# Altium footprint library VEGG_PcbLib_ALT.PcbLib: 140 footprints (part 5 of 9)
Each footprint in its own frame and in the unit in brackets; x right, y up, seen from the top. Pads: shape width x height; smd on the part's side, far side on the other; paste and mask are expansions set on the pad; w line width, h text height; cw(c..) or ccw(c..) is an arc to the next point about the centre after c.
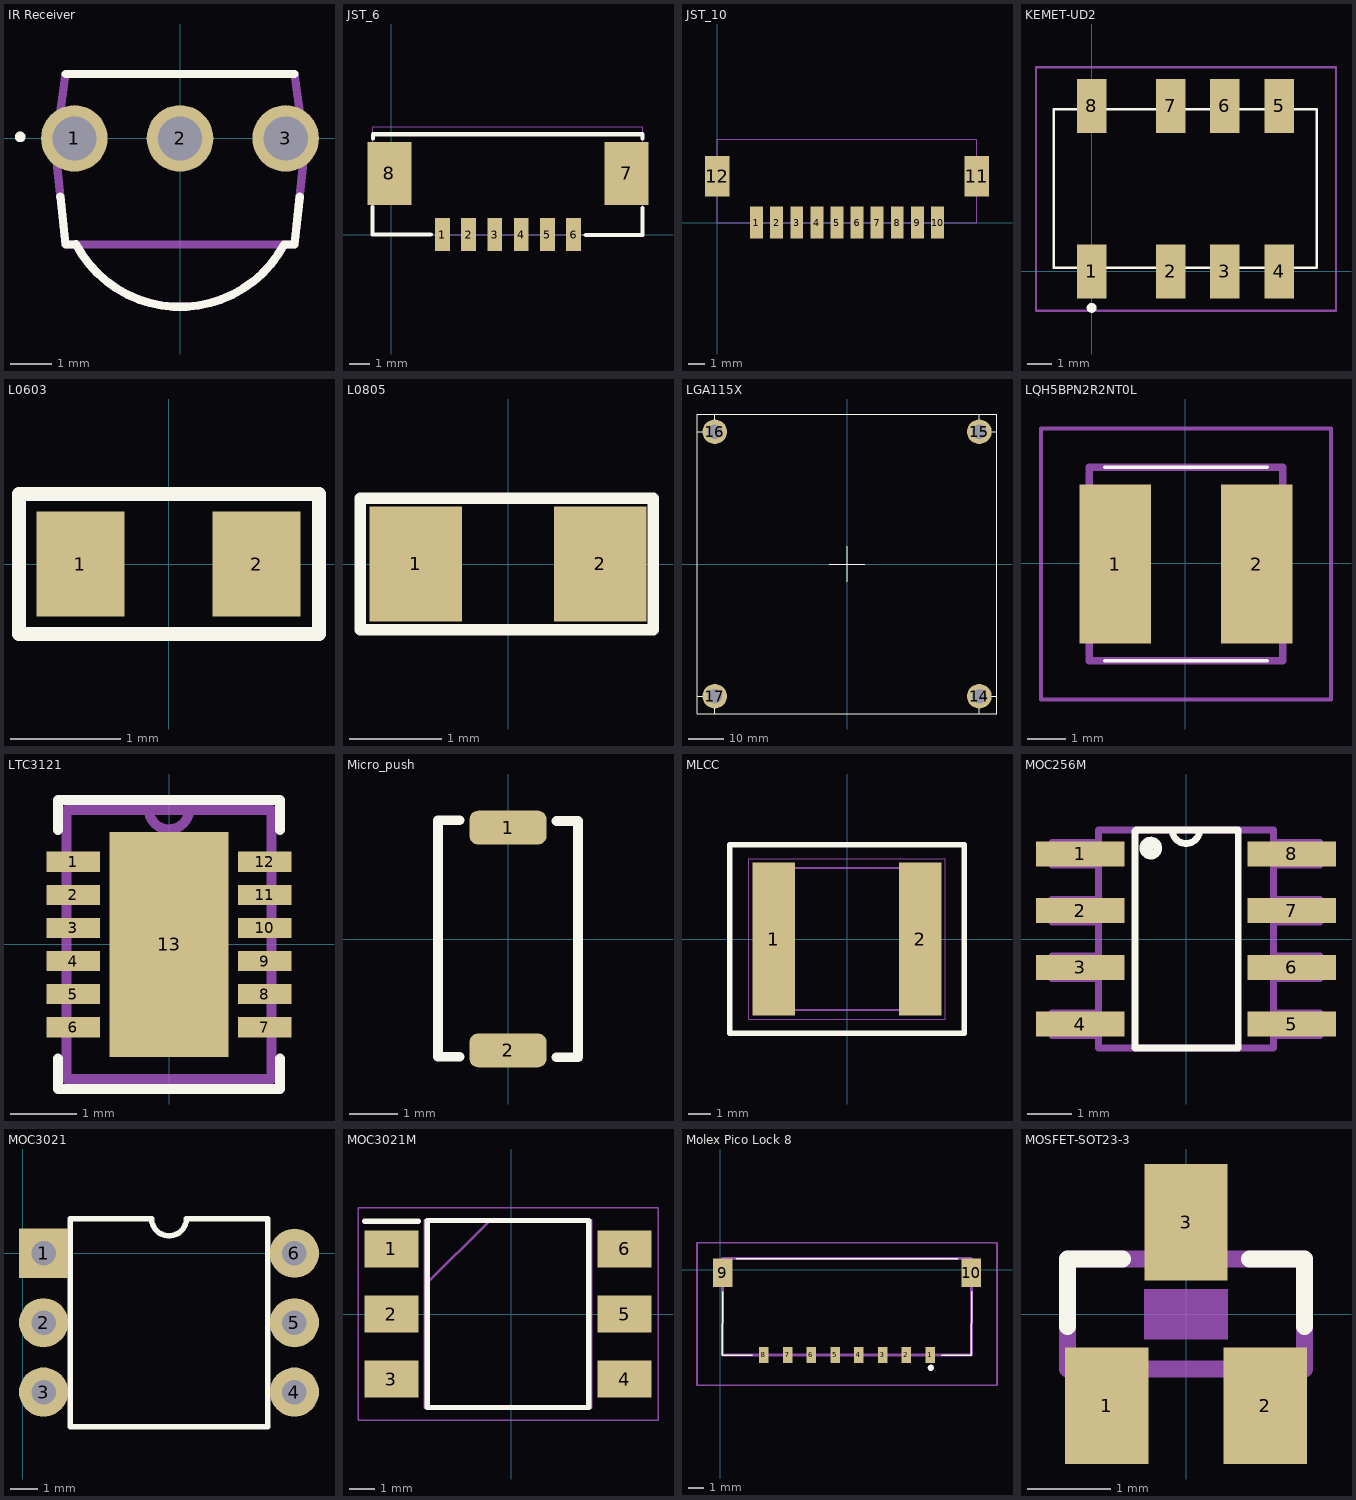
[diagram p4: the footprints below, top view; thin cyan lines are the x and y axes]

## IR Receiver [mm]
pads (3):
  round 1.6 hole 1.06: 1(-2.54,0) 2(0,0) 3(2.54,0)
Top Overlay:
  circle w0.2: c-3.841,0.038 r0.029
  lines w0.2: -2.875,-1.4 -2.75,-2.55 -2.5,-2.55 ; -2.75,1.55 2.75,1.55 ; -2.502,-2.547 ccw(c0,-1.217) 2.499,-2.551 ; 2.5,-2.55 2.75,-2.55 2.875,-1.4
Mechanical 13:
  lines w0.2: -2.5,-2.55 ccw(c0,-1.215) 2.5,-2.55 ; -3,-0.25 -2.75,-2.55 2.75,-2.55 3,-0.25 2.75,1.55 -2.75,1.55 -3,-0.25

## JST_6 [mm]
pads (8):
  rect 0.7x1.6 smd: 1(2.438,0) 2(3.686,0) 3(4.933,0) 4(6.217,0) 5(7.465,0) 6(8.712,0)
  rect 2.1x3 smd: 7(11.252,2.921) 8(-0.102,2.921)
Top Overlay:
  lines w0.2: -0.914,1.321 -0.914,0 1.88,0 ; -0.889,4.597 -0.889,4.801 12.014,4.801 12.014,4.597 ; 9.296,-0.025 12.014,-0.025 12.014,1.27
Mechanical 1:
  lines w0.025: -0.889,0 -0.889,5.156 12.014,5.156 12.014,0 -0.889,0
3D body: height 3.4, standoff 0, extent -0.889,0 12.014,5.156

## JST_10 [mm] "smd"
pads (12):
  rect 0.8x2 smd: 1(2.438,0) 2(3.686,0) 3(4.933,0) 4(6.181,0) 5(7.428,0) 6(8.676,0) 7(9.923,0) 8(11.17,0) 9(12.418,0) 10(13.665,0)
  rect 1.5x2.5 smd: 11(16.104,2.87) 12(0,2.87)
Mechanical 1:
  lines w0.025: 0,0 16.104,0 16.104,5.156 0,5.156 0,0

## KEMET-UD2 [mm] "SMT DPDT 2A Relay"
pads (8):
  rect 1.2x2.2 smd: 1(0,0) 2(3.2,0) 3(5.4,0) 4(7.6,0) 5(7.6,6.706) 6(5.4,6.706) 7(3.2,6.706) 8(0,6.706)
Top Overlay:
  lines w0.1: -1.534,0.152 9.134,0.152 9.134,6.579 -1.534,6.579 -1.534,0.152
  lines w0.2: -0.1,-1.478 cw(c0,-1.478) 0.1,-1.478 cw(c0,-1.478) -0.1,-1.478
Mechanical 20:
  lines w0.1: -2.255,-1.6 9.905,-1.6 9.905,8.28 -2.255,8.28 -2.255,-1.6
3D body "UD2-3SNU.step": height 5.46, standoff 0, extent -1.792,-0.838 9.108,7.562

## L0603 [mm]
pads (2):
  rect 0.8x0.95 smd: 1(-0.8,0) 2(0.8,0)
Top Overlay:
  lines w0.125: -1.359,-0.635 -1.359,0.635 1.367,0.635 1.367,-0.635 -1.359,-0.635

## L0805 [mm]
pads (2):
  rect 1x1.25 smd: 1(-1,0) 2(1,0)
Top Overlay:
  lines w0.125: -1.6,-0.711 1.575,-0.711 1.575,0.711 -1.6,0.711 -1.6,-0.711
3D body "R-0805.STEP": height 0.6, standoff 0, extent -1,-0.625 1,0.625

## LGA115X [mm] "heatsink dcload"
pads (4):
  round 7 hole 4.03: 14(37.5,-37.5) 15(37.5,37.5) 16(-37.5,37.5) 17(-37.5,-37.5)
Top Overlay:
  lines w0.203: -42.523,37.5 -37.5,37.5 -37.5,42.51 ; -37.5,-42.504 -37.5,-37.5 -42.504,-37.5 ; -5.029,0 0,0 ; 0,-5.004 0,0 ; 0,5.004 0,0 ; 5.004,0 0,0 ; -42.504,-37.5 -42.504,37.481 -42.504,42.51 -37.5,42.51 ; -42.504,-37.5 -42.504,-42.51 37.5,-42.51 ; -37.5,42.51 37.494,42.51 37.5,42.516 ; 37.5,-42.51 42.51,-42.51 42.51,-37.5 ; 37.5,-42.51 37.5,-37.5 42.51,-37.5 ; 37.5,42.516 42.504,42.516 42.504,37.5 ; 37.5,42.516 37.5,37.5 42.504,37.5 ; 42.504,37.5 42.504,-37.494 42.51,-37.5
3D body "Intel Stock LGA 1155 Cooler Assembly.stp": height 51.65, standoff -8.85, extent -87.608,-87.887 87.659,87.379

## LQH5BPN2R2NT0L [mm]
pads (2):
  rect 1.85x4.1 smd: 1(-1.8,-0.025) 2(1.85,-0.025)
Top Overlay:
  lines w0.1: -2.075,-2.525 2.125,-2.525 ; -2.075,2.475 2.125,2.475
Mechanical 13:
  lines w0.2: -2.475,-2.525 -2.475,2.475 2.525,2.475 2.525,-2.525 -2.475,-2.525
Mechanical 15:
  lines w0.1: -3.725,-3.525 -3.725,3.475 3.775,3.475 3.775,-3.525 -3.725,-3.525
3D body "LQH5BPN2R2NT0L.stp": height 2.3, standoff 0, extent -2.54,-2.525 2.59,2.475

## LTC3121 [mil]
pads (13):
  rect 32x12 smd: 1(-57,49.21) 2(-57,29.53) 3(-57,9.84) 4(-57,-9.84) 5(-57,-29.53) 6(-57,-49.21) 7(57,-49.21) 8(57,-29.53) 9(57,-9.84) 10(57,9.84) 11(57,29.53) 12(57,49.21)
  rect 71x134 smd: 13(0,0)
Top Overlay:
  lines w6: -66,-68 -66,-86 66,-86 66,-68 ; -66,68 -66,86 66,86 66,68
Top Paste:
  region: -31.56,-3.94 -31.56,-63.06 31.56,-63.06 31.56,-3.94
  region: -31.56,63.06 -31.56,3.94 31.56,3.94 31.56,63.06
Mechanical 4:
  lines w6: -61,-80 -61,80 ; -61,-80 61,-80 ; -61,-80 -61,80 ; -61,-80 61,-80 ; -61,80 -12,80 ; -61,80 -12,80 ; -12,80 61,80 ; -12,80 61,80 ; 61,-80 61,80 ; 61,-80 61,80 ; -12,80.08 ccw(c0,80.5) 12,80.92 cw(c0,80.5) -12,80.08

## Micro_push [mm]
pads (2):
  rrect50% 1.6x0.7 smd: 1(0,2.311) 2(0,-2.311)
Top Overlay:
  lines w0.2: -1.003,2.465 -1.452,2.465 -1.452,-2.446 -1,-2.446 ; 1.003,-2.45 1.45,-2.45 1.45,2.449 1.004,2.449
Mechanical 15:
  lines w0.1: -0.4,2.426 0.4,2.426 ; 0.133,2.426 0.4,2.159
3D body "User Library-Pushbutton3x4x2.STEP": height 1.95, standoff -0.05, extent -1.45,-2.45 1.45,2.45

## MLCC [mm]
pads (2):
  rect 1.89x6.81 smd: 1(-3.26,0) 2(3.26,0)
Top Overlay:
  lines w0.254: -5.207,-4.191 -5.207,4.191 5.207,4.191 5.207,-4.191 -5.207,-4.191
Mechanical 15:
  lines w0.1: -3.75,-3.15 -3.75,3.15 3.75,3.15 3.75,-3.15 -3.75,-3.15
Mechanical 20:
  lines w0.05: -4.355,-3.56 -4.355,3.56 4.355,3.56 4.355,-3.56 -4.355,-3.56
3D body "KTS501B125M76N0T00.stp": height 6.93, standoff 3.43, extent -3.75,-3.15 3.75,3.15
3D body "KTS501B125M76N0T00.stp": height 3.5, standoff 0, extent -3.75,-3.15 3.75,3.15

## MOC256M [mil] "AC Opto Isolator"
pads (8):
  rect 78x22 smd: 1(-93,75) 2(-93,25) 3(-93,-25) 4(-93,-75) 5(93,-75) 6(93,-25) 7(93,25) 8(93,75)
Top Overlay:
  circle w3.94: c-31,80 r1
  circle w3.94: c-31,80 r5
  circle w3.94: c-31,80 r8.06
  lines w6: -12,96 ccw(c0,96) 12,96 ; -12,96 -44,96 -45,95 -45,-96 46,-96 46,96 12,96 ; -12,96 12,96
Mechanical 1:
  lines w0: -12,96 ccw(c0,96) 12,96
  lines w6: -118,-85 -118,-65 -77,-65 -77,-85 -118,-85 ; -118,-35 -118,-15 -77,-15 -77,-35 -118,-35 ; -118,15 -118,35 -77,35 -77,15 -118,15 ; -118,65 -118,85 -77,85 -77,65 -118,65 ; -77,-96 77,-96 77,96 12,96 -12,96 -77,96 -77,-96 ; 77,-85 77,-65 118,-65 118,-85 77,-85 ; 77,-35 77,-15 118,-15 118,-35 77,-35 ; 77,15 77,35 118,35 118,15 77,15 ; 77,65 77,85 118,85 118,65 77,65
3D body "User Library-SOIC-8-1.SLDPRT": height 68.9, standoff 0, extent -116.1,-96.46 120.11,96.46

## MOC3021 [mm]
pads (6):
  rect 1.8x1.8 hole 0.9: 1(0.762,0)
  round 1.8 hole 0.9: 2(0.762,-2.54) 3(0.762,-5.08) 4(9.938,-5.08) 5(9.938,-2.54) 6(9.938,0)
Top Overlay:
  lines w0.2: 1.735,-6.35 8.965,-6.35 8.965,1.27 5.985,1.27 cw(c5.35,1.27) 4.715,1.27 1.735,1.27 1.735,-6.35
3D body "User Library-Optoacoplador_MOC3020.STEP": height 3.06, standoff -4.62, extent -0.044,-7.112 10.713,1.778

## MOC3021M [mm] "Smd Package Lite on"
pads (6):
  rect 2.1x1.45 smd: 1(-4.677,2.54) 2(-4.677,0) 3(-4.677,-2.54) 4(4.423,-2.54) 5(4.423,0) 6(4.423,2.54)
Top Overlay:
  lines w0.2: -5.727,3.615 -3.627,3.615 ; -3.277,-3.65 3.023,-3.65 3.023,3.65 -3.277,3.65 -3.277,-3.65
Mechanical 15:
  lines w0.1: -3.377,1.11 -0.837,3.65 ; -3.377,-3.65 3.123,-3.65 3.123,3.65 -3.377,3.65 -3.377,-3.65
Mechanical 20:
  lines w0.05: -5.977,-4.15 5.723,-4.15 5.723,4.15 -5.977,4.15 -5.977,-4.15
3D body "MOC3021S.stp": height 4, standoff 0, extent -5.08,-3.65 5.08,3.65

## Molex Pico Lock 8 [mm]
pads (10):
  rect 0.6x1 smd: 1(13.251,-5.384) 2(11.751,-5.384) 3(10.251,-5.384) 4(8.751,-5.384) 5(7.251,-5.384) 6(5.751,-5.384) 7(4.251,-5.384) 8(2.751,-5.384)
  rect 1.25x1.8 smd: 9(0.146,-0.194) 10(15.856,-0.194)
Top Overlay:
  lines w0.1: 0.146,-1.394 0.126,-5.384 2.001,-5.394 ; 1.001,0.706 15.001,0.706 ; 14.001,-5.394 15.856,-5.394 15.876,-1.394
  lines w0.2: 13.201,-6.194 ccw(c13.301,-6.194) 13.401,-6.194 ccw(c13.301,-6.194) 13.201,-6.194
Mechanical 15:
  lines w0.2: 0.126,-5.394 0.126,0.706 15.876,0.706 15.876,-5.394 0.126,-5.394
Mechanical 20:
  lines w0.1: -1.479,-7.294 -1.479,1.706 17.481,1.706 17.481,-7.294 -1.479,-7.294
3D body "5040500891.stp": height 1.89, standoff -0.11, extent -0.274,-5.588 16.276,0.852

## MOSFET-SOT23-3 [mm]
pads (3):
  rect 1x1.4 smd: 1(-0.95,-1.1) 2(0.95,-1.1) 3(0,1.1)
Top Overlay:
  lines w0.203: -1.422,-0.152 -1.422,0.66 -0.764,0.66 ; 0.764,0.66 1.422,0.66 1.422,-0.152
Mechanical 4:
  region: -0.5,0.3 0.5,0.3 0.5,-0.3 -0.5,-0.3
  region: -0.229,1.295 0.229,1.295 0.229,0.712 -0.229,0.712
  region: 0.711,-0.711 1.168,-0.711 1.168,-1.295 0.711,-1.295
  region: -1.169,-0.711 -0.711,-0.711 -0.711,-1.296 -1.169,-1.296
  region: -0.5,0.3 0.5,0.3 0.5,-0.3 -0.5,-0.3
  region: -0.229,1.295 0.229,1.295 0.229,0.712 -0.229,0.712
  region: 0.711,-0.711 1.168,-0.711 1.168,-1.295 0.711,-1.295
  region: -1.169,-0.711 -0.711,-0.711 -0.711,-1.296 -1.169,-1.296
  lines w0.203: -1.422,-0.66 1.422,-0.66 ; -1.422,-0.66 -1.422,0.66 ; -1.422,-0.66 1.422,-0.66 ; -1.422,-0.66 -1.422,0.66 ; -1.422,0.66 1.422,0.66 ; -1.422,0.66 1.422,0.66 ; 1.422,-0.66 1.422,0.66 ; 1.422,-0.66 1.422,0.66
3D body "BSS138_D87Z--3DModel-STEP-56544.STEP": height 1.11, standoff -0.09, extent -1.457,-1.347 1.463,1.053